# Altium footprint library SAMTEC SMD.PcbLib: 165 footprints (part 1 of 17) (continued)
## SAMTEC_ASP-134486-01 [mm] "Connector VITA 57, 400 Female contacts in 10 row abcdefghj" (continued)

## SAMTEC_ASP-134488-01 [mm] "Connector VITA 57, 400 Male contacts in 10 row abcdefghj"
height 6.1
pads (402):
  round 0.5 hole 1.3 unplated mask+0.4: 1(-27.191,-3.048) 2(27.191,0)
  round 0.64 smd paste+0.125: a1(24.765,5.715) a2(23.495,5.715) a3(22.225,5.715) a4(20.955,5.715) a5(19.685,5.715) a6(18.415,5.715) a7(17.145,5.715) a8(15.875,5.715) a9(14.605,5.715) a10(13.335,5.715) a11(12.065,5.715) a12(10.795,5.715) a13(9.525,5.715) a14(8.255,5.715) a15(6.985,5.715) a16(5.715,5.715) a17(4.445,5.715) a18(3.175,5.715) a19(1.905,5.715) a20(0.635,5.715) a21(-0.635,5.715) a22(-1.905,5.715) a23(-3.175,5.715) a24(-4.445,5.715) a25(-5.715,5.715) a26(-6.985,5.715) a27(-8.255,5.715) a28(-9.525,5.715) a29(-10.795,5.715) a30(-12.065,5.715) a31(-13.335,5.715) a32(-14.605,5.715) a33(-15.875,5.715) a34(-17.145,5.715) a35(-18.415,5.715) a36(-19.685,5.715) a37(-20.955,5.715) a38(-22.225,5.715) a39(-23.495,5.715) a40(-24.765,5.715) b1(24.765,4.445) b2(23.495,4.445) b3(22.225,4.445) b4(20.955,4.445) b5(19.685,4.445) b6(18.415,4.445) b7(17.145,4.445) b8(15.875,4.445) b9(14.605,4.445) b10(13.335,4.445) b11(12.065,4.445) b12(10.795,4.445) b13(9.525,4.445) b14(8.255,4.445) b15(6.985,4.445) b16(5.715,4.445) b17(4.445,4.445) b18(3.175,4.445) b19(1.905,4.445) b20(0.635,4.445) b21(-0.635,4.445) b22(-1.905,4.445) b23(-3.175,4.445) b24(-4.445,4.445) b25(-5.715,4.445) b26(-6.985,4.445) b27(-8.255,4.445) b28(-9.525,4.445) b29(-10.795,4.445) b30(-12.065,4.445) b31(-13.335,4.445) b32(-14.605,4.445) b33(-15.875,4.445) b34(-17.145,4.445) b35(-18.415,4.445) b36(-19.685,4.445) b37(-20.955,4.445) b38(-22.225,4.445) b39(-23.495,4.445) b40(-24.765,4.445) c1(24.765,3.175) c2(23.495,3.175) c3(22.225,3.175) c4(20.955,3.175) c5(19.685,3.175) c6(18.415,3.175) c7(17.145,3.175) c8(15.875,3.175) c9(14.605,3.175) c10(13.335,3.175) c11(12.065,3.175) c12(10.795,3.175) c13(9.525,3.175) c14(8.255,3.175) c15(6.985,3.175) c16(5.715,3.175) c17(4.445,3.175) c18(3.175,3.175) c19(1.905,3.175) c20(0.635,3.175) c21(-0.635,3.175) c22(-1.905,3.175) c23(-3.175,3.175) c24(-4.445,3.175) c25(-5.715,3.175) c26(-6.985,3.175) c27(-8.255,3.175) c28(-9.525,3.175) c29(-10.795,3.175) c30(-12.065,3.175) c31(-13.335,3.175) c32(-14.605,3.175) c33(-15.875,3.175) c34(-17.145,3.175) c35(-18.415,3.175) c36(-19.685,3.175) c37(-20.955,3.175) c38(-22.225,3.175) c39(-23.495,3.175) c40(-24.765,3.175) d1(24.765,1.905) d2(23.495,1.905) d3(22.225,1.905) d4(20.955,1.905) d5(19.685,1.905) d6(18.415,1.905) d7(17.145,1.905) d8(15.875,1.905) d9(14.605,1.905) d10(13.335,1.905) d11(12.065,1.905) d12(10.795,1.905) d13(9.525,1.905) d14(8.255,1.905) d15(6.985,1.905) d16(5.715,1.905) d17(4.445,1.905) d18(3.175,1.905) d19(1.905,1.905) d20(0.635,1.905) d21(-0.635,1.905) d22(-1.905,1.905) d23(-3.175,1.905) d24(-4.445,1.905) d25(-5.715,1.905) d26(-6.985,1.905) d27(-8.255,1.905) d28(-9.525,1.905) d29(-10.795,1.905) d30(-12.065,1.905) d31(-13.335,1.905) d32(-14.605,1.905) d33(-15.875,1.905) d34(-17.145,1.905) d35(-18.415,1.905) d36(-19.685,1.905) d37(-20.955,1.905) d38(-22.225,1.905) d39(-23.495,1.905) d40(-24.765,1.905) e1(24.765,0.635) e2(23.495,0.635) e3(22.225,0.635) e4(20.955,0.635) e5(19.685,0.635) e6(18.415,0.635) e7(17.145,0.635) e8(15.875,0.635) e9(14.605,0.635) e10(13.335,0.635) e11(12.065,0.635) e12(10.795,0.635) e13(9.525,0.635) e14(8.255,0.635) e15(6.985,0.635) e16(5.715,0.635) e17(4.445,0.635) e18(3.175,0.635) e19(1.905,0.635) e20(0.635,0.635) e21(-0.635,0.635) e22(-1.905,0.635) e23(-3.175,0.635) e24(-4.445,0.635) e25(-5.715,0.635) e26(-6.985,0.635) e27(-8.255,0.635) e28(-9.525,0.635) e29(-10.795,0.635) e30(-12.065,0.635) e31(-13.335,0.635) e32(-14.605,0.635) e33(-15.875,0.635) e34(-17.145,0.635) e35(-18.415,0.635) e36(-19.685,0.635) e37(-20.955,0.635) e38(-22.225,0.635) e39(-23.495,0.635) e40(-24.765,0.635) f1(24.765,-0.635) f2(23.495,-0.635) f3(22.225,-0.635) f4(20.955,-0.635) f5(19.685,-0.635) f6(18.415,-0.635) f7(17.145,-0.635) f8(15.875,-0.635) f9(14.605,-0.635) f10(13.335,-0.635) f11(12.065,-0.635) f12(10.795,-0.635) f13(9.525,-0.635) f14(8.255,-0.635) f15(6.985,-0.635) f16(5.715,-0.635) f17(4.445,-0.635) f18(3.175,-0.635) f19(1.905,-0.635) f20(0.635,-0.635) f21(-0.635,-0.635) f22(-1.905,-0.635) f23(-3.175,-0.635) f24(-4.445,-0.635) f25(-5.715,-0.635) f26(-6.985,-0.635) f27(-8.255,-0.635) f28(-9.525,-0.635) f29(-10.795,-0.635) f30(-12.065,-0.635) f31(-13.335,-0.635) f32(-14.605,-0.635) f33(-15.875,-0.635) f34(-17.145,-0.635) f35(-18.415,-0.635) f36(-19.685,-0.635) f37(-20.955,-0.635) f38(-22.225,-0.635) f39(-23.495,-0.635) f40(-24.765,-0.635) g1(24.765,-1.905) g2(23.495,-1.905) g3(22.225,-1.905) g4(20.955,-1.905) g5(19.685,-1.905) g6(18.415,-1.905) g7(17.145,-1.905) g8(15.875,-1.905) g9(14.605,-1.905) g10(13.335,-1.905) g11(12.065,-1.905) g12(10.795,-1.905) g13(9.525,-1.905) g14(8.255,-1.905) g15(6.985,-1.905) g16(5.715,-1.905) g17(4.445,-1.905) g18(3.175,-1.905) g19(1.905,-1.905) g20(0.635,-1.905) g21(-0.635,-1.905) g22(-1.905,-1.905) g23(-3.175,-1.905) g24(-4.445,-1.905) g25(-5.715,-1.905) g26(-6.985,-1.905) g27(-8.255,-1.905) g28(-9.525,-1.905) g29(-10.795,-1.905) g30(-12.065,-1.905) g31(-13.335,-1.905) g32(-14.605,-1.905) g33(-15.875,-1.905) g34(-17.145,-1.905) g35(-18.415,-1.905) g36(-19.685,-1.905) g37(-20.955,-1.905) g38(-22.225,-1.905) g39(-23.495,-1.905) g40(-24.765,-1.905) h1(24.765,-3.175) h2(23.495,-3.175) h3(22.225,-3.175) h4(20.955,-3.175) h5(19.685,-3.175) h6(18.415,-3.175) h7(17.145,-3.175) h8(15.875,-3.175) h9(14.605,-3.175) h10(13.335,-3.175) h11(12.065,-3.175) h12(10.795,-3.175) h13(9.525,-3.175) h14(8.255,-3.175) h15(6.985,-3.175) h16(5.715,-3.175) h17(4.445,-3.175) h18(3.175,-3.175) h19(1.905,-3.175) h20(0.635,-3.175) h21(-0.635,-3.175) h22(-1.905,-3.175) h23(-3.175,-3.175) h24(-4.445,-3.175) h25(-5.715,-3.175) h26(-6.985,-3.175) h27(-8.255,-3.175) h28(-9.525,-3.175) h29(-10.795,-3.175) h30(-12.065,-3.175) h31(-13.335,-3.175) h32(-14.605,-3.175) h33(-15.875,-3.175) h34(-17.145,-3.175) h35(-18.415,-3.175) h36(-19.685,-3.175) h37(-20.955,-3.175) h38(-22.225,-3.175) h39(-23.495,-3.175) h40(-24.765,-3.175) j1(24.765,-4.445) j2(23.495,-4.445) j3(22.225,-4.445) j4(20.955,-4.445) j5(19.685,-4.445) j6(18.415,-4.445) j7(17.145,-4.445) j8(15.875,-4.445) j9(14.605,-4.445) j10(13.335,-4.445) j11(12.065,-4.445) j12(10.795,-4.445) j13(9.525,-4.445) j14(8.255,-4.445) j15(6.985,-4.445) j16(5.715,-4.445) j17(4.445,-4.445) j18(3.175,-4.445) j19(1.905,-4.445) j20(0.635,-4.445) j21(-0.635,-4.445) j22(-1.905,-4.445) j23(-3.175,-4.445) j24(-4.445,-4.445) j25(-5.715,-4.445) j26(-6.985,-4.445) j27(-8.255,-4.445) j28(-9.525,-4.445) j29(-10.795,-4.445) j30(-12.065,-4.445) j31(-13.335,-4.445) j32(-14.605,-4.445) j33(-15.875,-4.445) j34(-17.145,-4.445) j35(-18.415,-4.445) j36(-19.685,-4.445) j37(-20.955,-4.445) j38(-22.225,-4.445) j39(-23.495,-4.445) j40(-24.765,-4.445) k1(24.765,-5.715) k2(23.495,-5.715) k3(22.225,-5.715) k4(20.955,-5.715) k5(19.685,-5.715) k6(18.415,-5.715) k7(17.145,-5.715) k8(15.875,-5.715) k9(14.605,-5.715) k10(13.335,-5.715) k11(12.065,-5.715) k12(10.795,-5.715) k13(9.525,-5.715) k14(8.255,-5.715) k15(6.985,-5.715) k16(5.715,-5.715) k17(4.445,-5.715) k18(3.175,-5.715) k19(1.905,-5.715) k20(0.635,-5.715) k21(-0.635,-5.715) k22(-1.905,-5.715) k23(-3.175,-5.715) k24(-4.445,-5.715) k25(-5.715,-5.715) k26(-6.985,-5.715) k27(-8.255,-5.715) k28(-9.525,-5.715) k29(-10.795,-5.715) k30(-12.065,-5.715) k31(-13.335,-5.715) k32(-14.605,-5.715) k33(-15.875,-5.715) k34(-17.145,-5.715) k35(-18.415,-5.715) k36(-19.685,-5.715) k37(-20.955,-5.715) k38(-22.225,-5.715) k39(-23.495,-5.715) k40(-24.765,-5.715)
Top Overlay:
  drawing of 637 lines, arcs and shapes, not listed
  text "1" at 25.417,-8.073 h1
  text "40" at -27.305,-7.112 h1
  text "k" at 29.989,-5.914 h1
  text "j" at 29.862,-4.771 h1
  text "g" at 29.862,-2.231 h1
  text "h" at 29.972,-3.556 h1
  text "f" at 30.116,-0.961 h1
  text "a" at 29.972,5.461 h1
  text "b" at 29.972,4.191 h1
  text "c" at 29.972,2.921 h1
  text "d" at 29.989,1.545 h1
  text "e" at 29.949,0.307 h1
Mechanical 8:
  drawing of 1622 lines, arcs and shapes, not listed
Mechanical 14:
  drawing of 4433 lines, arcs and shapes, not listed
  text "1" at 25.417,-8.073 h1
  text "40" at -27.305,-7.112 h1
  text "k" at 29.989,-5.914 h1
  text "j" at 29.862,-4.771 h1
  text "g" at 29.862,-2.231 h1
  text "h" at 29.972,-3.556 h1
  text "f" at 30.116,-0.961 h1
  text "e" at 29.949,0.307 h1
  text "d" at 29.989,1.545 h1
  text "c" at 29.972,2.921 h1
  text "b" at 29.972,4.191 h1
  text "a" at 29.972,5.461 h1
3D body "SAMTEC_ASP-134488-01.stp": height 5.61, standoff -1.27, extent -27.889,-7.341 28.778,7.341

## SAMTEC_ASP-134603-01 [mm] "Connector VITA 57 (Low Pin Count version), 160 Female contacts in 4 row cdgh"
height 6.55
pads (162):
  round 0.5 hole 1.3 unplated mask+0.4: 1(-27.19,0) 2(27.19,-3.05)
  round 0.64 smd paste+0.125: c1(24.765,-3.175) c2(23.495,-3.175) c3(22.225,-3.175) c4(20.955,-3.175) c5(19.685,-3.175) c6(18.415,-3.175) c7(17.145,-3.175) c8(15.875,-3.175) c9(14.605,-3.175) c10(13.335,-3.175) c11(12.065,-3.175) c12(10.795,-3.175) c13(9.525,-3.175) c14(8.255,-3.175) c15(6.985,-3.175) c16(5.715,-3.175) c17(4.445,-3.175) c18(3.175,-3.175) c19(1.905,-3.175) c20(0.635,-3.175) c21(-0.635,-3.175) c22(-1.905,-3.175) c23(-3.175,-3.175) c24(-4.445,-3.175) c25(-5.715,-3.175) c26(-6.985,-3.175) c27(-8.255,-3.175) c28(-9.525,-3.175) c29(-10.795,-3.175) c30(-12.065,-3.175) c31(-13.335,-3.175) c32(-14.605,-3.175) c33(-15.875,-3.175) c34(-17.145,-3.175) c35(-18.415,-3.175) c36(-19.685,-3.175) c37(-20.955,-3.175) c38(-22.225,-3.175) c39(-23.495,-3.175) c40(-24.765,-3.175) d1(24.765,-1.905) d2(23.495,-1.905) d3(22.225,-1.905) d4(20.955,-1.905) d5(19.685,-1.905) d6(18.415,-1.905) d7(17.145,-1.905) d8(15.875,-1.905) d9(14.605,-1.905) d10(13.335,-1.905) d11(12.065,-1.905) d12(10.795,-1.905) d13(9.525,-1.905) d14(8.255,-1.905) d15(6.985,-1.905) d16(5.715,-1.905) d17(4.445,-1.905) d18(3.175,-1.905) d19(1.905,-1.905) d20(0.635,-1.905) d21(-0.635,-1.905) d22(-1.905,-1.905) d23(-3.175,-1.905) d24(-4.445,-1.905) d25(-5.715,-1.905) d26(-6.985,-1.905) d27(-8.255,-1.905) d28(-9.525,-1.905) d29(-10.795,-1.905) d30(-12.065,-1.905) d31(-13.335,-1.905) d32(-14.605,-1.905) d33(-15.875,-1.905) d34(-17.145,-1.905) d35(-18.415,-1.905) d36(-19.685,-1.905) d37(-20.955,-1.905) d38(-22.225,-1.905) d39(-23.495,-1.905) d40(-24.765,-1.905) g1(24.765,1.905) g2(23.495,1.905) g3(22.225,1.905) g4(20.955,1.905) g5(19.685,1.905) g6(18.415,1.905) g7(17.145,1.905) g8(15.875,1.905) g9(14.605,1.905) g10(13.335,1.905) g11(12.065,1.905) g12(10.795,1.905) g13(9.525,1.905) g14(8.255,1.905) g15(6.985,1.905) g16(5.715,1.905) g17(4.445,1.905) g18(3.175,1.905) g19(1.905,1.905) g20(0.635,1.905) g21(-0.635,1.905) g22(-1.905,1.905) g23(-3.175,1.905) g24(-4.445,1.905) g25(-5.715,1.905) g26(-6.985,1.905) g27(-8.255,1.905) g28(-9.525,1.905) g29(-10.795,1.905) g30(-12.065,1.905) g31(-13.335,1.905) g32(-14.605,1.905) g33(-15.875,1.905) g34(-17.145,1.905) g35(-18.415,1.905) g36(-19.685,1.905) g37(-20.955,1.905) g38(-22.225,1.905) g39(-23.495,1.905) g40(-24.765,1.905) h1(24.765,3.175) h2(23.495,3.175) h3(22.225,3.175) h4(20.955,3.175) h5(19.685,3.175) h6(18.415,3.175) h7(17.145,3.175) h8(15.875,3.175) h9(14.605,3.175) h10(13.335,3.175) h11(12.065,3.175) h12(10.795,3.175) h13(9.525,3.175) h14(8.255,3.175) h15(6.985,3.175) h16(5.715,3.175) h17(4.445,3.175) h18(3.175,3.175) h19(1.905,3.175) h20(0.635,3.175) h21(-0.635,3.175) h22(-1.905,3.175) h23(-3.175,3.175) h24(-4.445,3.175) h25(-5.715,3.175) h26(-6.985,3.175) h27(-8.255,3.175) h28(-9.525,3.175) h29(-10.795,3.175) h30(-12.065,3.175) h31(-13.335,3.175) h32(-14.605,3.175) h33(-15.875,3.175) h34(-17.145,3.175) h35(-18.415,3.175) h36(-19.685,3.175) h37(-20.955,3.175) h38(-22.225,3.175) h39(-23.495,3.175) h40(-24.765,3.175)
Top Overlay:
  lines w0.2: -27.889,-1.213 -27.889,-2.197 -28.727,-2.197 -28.727,-6.617 27.889,-6.617 27.889,-4.263 ; -27.889,1.213 -27.889,2.197 -28.727,2.197 -28.727,6.617 27.889,6.617 27.889,2.845 28.727,2.845 28.727,-2.845 28.575,-2.845 ; -27.305,-1.395 -27.305,-2.477 ; -27.305,1.395 -27.305,2.476 ; -27.051,-1.393 -27.051,-2.858 ; -27.051,1.393 -27.051,2.857 ; -25.5,-5.855 -28.067,-5.855 ; -25.5,5.855 -28.067,5.855 ; -24.994,-6.236 -28.448,-6.236 ; -24.994,6.236 -28.448,6.236 ; 25.2,-6.109 27.305,-6.109 ; 25.2,6.109 27.305,6.109 ; 27.051,-4.443 27.051,-5.855 27.305,-6.109 ; 27.305,-4.445 27.305,-6.109 ; 28.067,-1.959 28.067,2.184 ; 28.448,-2.436 28.448,2.565 ; -28.448,-6.236 -28.448,-2.477 ; -28.448,-6.236 -28.067,-5.855 ; -28.448,-2.477 -27.305,-2.477 ; -28.448,-2.477 -28.067,-2.858 ; -28.448,2.476 -28.448,6.236 ; -28.448,2.476 -27.305,2.476 ; -28.448,2.476 -28.067,2.857 ; -28.448,6.236 -28.067,5.855 ; -28.067,-5.855 -28.067,-2.858 ; -28.067,-2.858 -27.051,-2.858 ; -28.067,2.857 -27.051,2.857 ; -28.067,2.857 -28.067,5.855 ; -27.305,-2.477 -27.051,-2.858 ; -27.305,2.476 -27.051,2.857 ; 27.051,2.184 27.051,5.855 27.305,6.109 ; 27.051,2.184 28.067,2.184 ; 27.051,2.184 27.305,2.565 ; 27.305,2.565 28.448,2.565 ; 27.305,2.565 27.305,6.109 ; 28.067,2.184 28.448,2.565
  text "e" at 29.949,-0.836 h1
  text "d" at 29.989,-2.392 h1
  text "c" at 29.972,-3.556 h1
  text "b" at 29.972,-4.826 h1
  text "a" at 29.972,-6.096 h1
  text "f" at 30.116,0.436 h1
  text "h" at 29.972,2.921 h1
  text "g" at 29.862,1.579 h1
  text "j" at 29.989,4.246 h1
  text "k" at 29.989,5.516 h1
  text "40" at -26.289,-5.461 h1.2
  text "1" at 25.29,-7.438 h1
Mechanical 8:
  drawing of 1618 lines, arcs and shapes, not listed
Mechanical 14:
  drawing of 1424 lines, arcs and shapes, not listed
  text "a" at 29.972,-6.096 h1
  text "b" at 29.972,-4.826 h1
  text "c" at 29.972,-3.556 h1
  text "d" at 29.989,-2.392 h1
  text "e" at 29.949,-0.836 h1
  text "f" at 30.116,0.436 h1
  text "h" at 29.972,2.921 h1
  text "g" at 29.862,1.579 h1
  text "j" at 29.989,4.246 h1
  text "k" at 29.989,5.516 h1
  text "40" at -26.289,-5.461 h1.2
  text "1" at 25.29,-7.438 h1
3D body "SAMTEC_ASP-134603-01.stp": height 6.55, standoff -1.27, extent -28.727,-6.618 28.727,6.618

## SAMTEC_ASP-134604-01 [mm] "Connector VITA 57, 160 Male contacts in 4 row cdgh"
height 6.1
pads (162):
  round 0.5 hole 1.3 unplated mask+0.4: 1(-27.191,-3.048) 2(27.191,0)
  round 0.64 smd paste+0.125: c1(24.765,3.175) c2(23.495,3.175) c3(22.225,3.175) c4(20.955,3.175) c5(19.685,3.175) c6(18.415,3.175) c7(17.145,3.175) c8(15.875,3.175) c9(14.605,3.175) c10(13.335,3.175) c11(12.065,3.175) c12(10.795,3.175) c13(9.525,3.175) c14(8.255,3.175) c15(6.985,3.175) c16(5.715,3.175) c17(4.445,3.175) c18(3.175,3.175) c19(1.905,3.175) c20(0.635,3.175) c21(-0.635,3.175) c22(-1.905,3.175) c23(-3.175,3.175) c24(-4.445,3.175) c25(-5.715,3.175) c26(-6.985,3.175) c27(-8.255,3.175) c28(-9.525,3.175) c29(-10.795,3.175) c30(-12.065,3.175) c31(-13.335,3.175) c32(-14.605,3.175) c33(-15.875,3.175) c34(-17.145,3.175) c35(-18.415,3.175) c36(-19.685,3.175) c37(-20.955,3.175) c38(-22.225,3.175) c39(-23.495,3.175) c40(-24.765,3.175) d1(24.765,1.905) d2(23.495,1.905) d3(22.225,1.905) d4(20.955,1.905) d5(19.685,1.905) d6(18.415,1.905) d7(17.145,1.905) d8(15.875,1.905) d9(14.605,1.905) d10(13.335,1.905) d11(12.065,1.905) d12(10.795,1.905) d13(9.525,1.905) d14(8.255,1.905) d15(6.985,1.905) d16(5.715,1.905) d17(4.445,1.905) d18(3.175,1.905) d19(1.905,1.905) d20(0.635,1.905) d21(-0.635,1.905) d22(-1.905,1.905) d23(-3.175,1.905) d24(-4.445,1.905) d25(-5.715,1.905) d26(-6.985,1.905) d27(-8.255,1.905) d28(-9.525,1.905) d29(-10.795,1.905) d30(-12.065,1.905) d31(-13.335,1.905) d32(-14.605,1.905) d33(-15.875,1.905) d34(-17.145,1.905) d35(-18.415,1.905) d36(-19.685,1.905) d37(-20.955,1.905) d38(-22.225,1.905) d39(-23.495,1.905) d40(-24.765,1.905) g1(24.765,-1.905) g2(23.495,-1.905) g3(22.225,-1.905) g4(20.955,-1.905) g5(19.685,-1.905) g6(18.415,-1.905) g7(17.145,-1.905) g8(15.875,-1.905) g9(14.605,-1.905) g10(13.335,-1.905) g11(12.065,-1.905) g12(10.795,-1.905) g13(9.525,-1.905) g14(8.255,-1.905) g15(6.985,-1.905) g16(5.715,-1.905) g17(4.445,-1.905) g18(3.175,-1.905) g19(1.905,-1.905) g20(0.635,-1.905) g21(-0.635,-1.905) g22(-1.905,-1.905) g23(-3.175,-1.905) g24(-4.445,-1.905) g25(-5.715,-1.905) g26(-6.985,-1.905) g27(-8.255,-1.905) g28(-9.525,-1.905) g29(-10.795,-1.905) g30(-12.065,-1.905) g31(-13.335,-1.905) g32(-14.605,-1.905) g33(-15.875,-1.905) g34(-17.145,-1.905) g35(-18.415,-1.905) g36(-19.685,-1.905) g37(-20.955,-1.905) g38(-22.225,-1.905) g39(-23.495,-1.905) g40(-24.765,-1.905) h1(24.765,-3.175) h2(23.495,-3.175) h3(22.225,-3.175) h4(20.955,-3.175) h5(19.685,-3.175) h6(18.415,-3.175) h7(17.145,-3.175) h8(15.875,-3.175) h9(14.605,-3.175) h10(13.335,-3.175) h11(12.065,-3.175) h12(10.795,-3.175) h13(9.525,-3.175) h14(8.255,-3.175) h15(6.985,-3.175) h16(5.715,-3.175) h17(4.445,-3.175) h18(3.175,-3.175) h19(1.905,-3.175) h20(0.635,-3.175) h21(-0.635,-3.175) h22(-1.905,-3.175) h23(-3.175,-3.175) h24(-4.445,-3.175) h25(-5.715,-3.175) h26(-6.985,-3.175) h27(-8.255,-3.175) h28(-9.525,-3.175) h29(-10.795,-3.175) h30(-12.065,-3.175) h31(-13.335,-3.175) h32(-14.605,-3.175) h33(-15.875,-3.175) h34(-17.145,-3.175) h35(-18.415,-3.175) h36(-19.685,-3.175) h37(-20.955,-3.175) h38(-22.225,-3.175) h39(-23.495,-3.175) h40(-24.765,-3.175)
Top Overlay:
  drawing of 605 lines, arcs and shapes, not listed
  text "1" at 25.417,-8.073 h1
  text "40" at -24.3,-5.8 h1
  text "g" at 29.862,-2.231 h1
  text "h" at 29.972,-3.556 h1
  text "c" at 29.972,2.921 h1
  text "d" at 29.989,1.545 h1
Mechanical 8:
  drawing of 648 lines, arcs and shapes, not listed
Mechanical 14:
  drawing of 4433 lines, arcs and shapes, not listed
  text "1" at 25.417,-8.073 h1
  text "g" at 29.862,-2.231 h1
  text "h" at 29.972,-3.556 h1
  text "d" at 29.989,1.545 h1
  text "c" at 29.972,2.921 h1
3D body "SAMTEC_ASP-134604-01.stp": height 5.61, standoff -1.27, extent -27.889,-7.34 28.778,7.341

## SAMTEC_BAR-J-22 [mm] "22 Positions Bulls Eye® High-Density, High-Performance Test Point Array"
height 12
pads (180):
  round 0.76 hole 0.25: 1(-4.953,5.715) 2(-1.651,5.715) 3(1.651,5.715) 4(4.953,5.715) 5(-6.604,2.857) 6(-3.302,2.857) 7(0,2.857) 8(3.302,2.857) 9(6.604,2.857) 10(-4.953,0) 11(-1.651,0) 12(1.651,0) 13(4.953,0) 14(-6.604,-2.857) 15(-3.302,-2.857) 16(0,-2.857) 17(3.302,-2.857) 18(6.604,-2.857) 19(-4.953,-5.715) 20(-1.651,-5.715) 21(1.651,-5.715) 22(4.953,-5.715)
  round 0.5 hole 0.25 mask-0.2: G1(-5.968,5.715) G1(-5.671,4.997) G1(-5.671,6.433) G1(-4.953,6.73) G1(-4.235,4.997) G1(-4.235,6.433) G1(-3.938,5.715) G2(-2.666,5.715) G2(-2.369,4.997) G2(-2.369,6.433) G2(-1.651,6.73) G2(-0.933,4.997) G2(-0.933,6.433) G2(-0.636,5.715) G3(0.636,5.715) G3(0.933,4.997) G3(0.933,6.433) G3(1.651,6.73) G3(2.369,4.997) G3(2.369,6.433) G3(2.666,5.715) G4(3.938,5.715) G4(4.235,4.997) G4(4.235,6.433) G4(4.953,6.73) G4(5.671,4.997) G4(5.671,6.433) G4(5.968,5.715) G5(-7.619,2.857) G5(-7.322,2.14) G5(-7.322,3.575) G5(-6.604,3.872) G5(-5.886,2.14) G5(-5.886,3.575) G5(-5.589,2.857) G6(-4.317,2.857) G6(-4.02,2.14) G6(-4.02,3.575) G6(-3.302,3.872) G6(-2.584,2.14) G6(-2.584,3.575) G6(-2.287,2.857) G7(-1.015,2.857) G7(-0.718,2.14) G7(-0.718,3.575) G7(0,3.872) G7(0.718,2.14) G7(0.718,3.575) G7(1.015,2.857) G8(2.287,2.857) G8(2.584,2.14) G8(2.584,3.575) G8(3.302,3.872) G8(4.02,2.14) G8(4.02,3.575) G8(4.317,2.857) G9(5.589,2.857) G9(5.886,2.14) G9(5.886,3.575) G9(6.604,3.872) G9(7.322,2.14) G9(7.322,3.575) G9(7.619,2.857) G10(-5.968,0) G10(-5.671,-0.718) G10(-5.671,0.718) G10(-4.953,1.015) G10(-4.235,-0.718) G10(-4.235,0.718) G10(-3.938,0) G11(-2.666,0) G11(-2.369,-0.718) G11(-2.369,0.718) G11(-1.651,1.015) G11(-0.933,-0.718) G11(-0.933,0.718) G11(-0.636,0) G12(0.636,0) G12(0.933,-0.718) G12(0.933,0.718) G12(1.651,1.015) G12(2.369,-0.718) G12(2.369,0.718) G12(2.666,0) G13(3.938,0) G13(4.235,-0.718) G13(4.235,0.718) G13(4.953,1.015) G13(5.671,-0.718) G13(5.671,0.718) G13(5.968,0) G14(-7.619,-2.857) G14(-7.322,-3.575) G14(-7.322,-2.14) G14(-6.604,-1.843) G14(-5.886,-3.575) G14(-5.886,-2.14) G14(-5.589,-2.857) G15(-4.317,-2.857) G15(-4.02,-3.575) G15(-4.02,-2.14) G15(-3.302,-1.843) G15(-2.584,-3.575) G15(-2.584,-2.14) G15(-2.287,-2.857) G16(-1.015,-2.857) G16(-0.718,-3.575) G16(-0.718,-2.14) G16(0,-1.843) G16(0.718,-3.575) G16(0.718,-2.14) G16(1.015,-2.857) G17(2.287,-2.857) G17(2.584,-3.575) G17(2.584,-2.14) G17(3.302,-1.843) G17(4.02,-3.575) G17(4.02,-2.14) G17(4.317,-2.857) G18(5.589,-2.857) G18(5.886,-3.575) G18(5.886,-2.14) G18(6.604,-1.843) G18(7.322,-3.575) G18(7.322,-2.14) G18(7.619,-2.857) G19(-5.968,-5.715) G19(-5.671,-6.433) G19(-5.671,-4.997) G19(-4.953,-4.7) G19(-4.235,-6.433) G19(-4.235,-4.997) G19(-3.938,-5.715) G20(-2.666,-5.715) G20(-2.369,-6.433) G20(-2.369,-4.997) G20(-1.651,-4.7) G20(-0.933,-6.433) G20(-0.933,-4.997) G20(-0.636,-5.715) G21(0.636,-5.715) G21(0.933,-6.433) G21(0.933,-4.997) G21(1.651,-4.7) G21(2.369,-6.433) G21(2.369,-4.997) G21(2.666,-5.715) G22(3.938,-5.715) G22(4.235,-6.433) G22(4.235,-4.997) G22(4.953,-4.7) G22(5.671,-6.433) G22(5.671,-4.997) G22(5.968,-5.715)
  round 1 hole 2.8 unplated mask+0.9: MECH(-8.255,0) MECH(8.255,0)
  round 1 hole 1.65 unplated mask+0.325: MECH(-8.04,5.61) MECH(8.04,5.61)
Top Layer:
  region: -6.683,5.719 -5.713,5.719 -5.707,5.818 -5.655,6.01 -5.556,6.182 -5.416,6.322 -5.244,6.421 -5.052,6.472 -4.854,6.472 -4.662,6.421 -4.491,6.322 -4.35,6.182 -4.251,6.01 -4.2,5.818 -4.193,5.719 -2.411,5.719 -2.405,5.818 -2.353,6.01 -2.254,6.182 -2.114,6.322 -1.942,6.421 -1.75,6.472 -1.552,6.472 -1.36,6.421 -1.189,6.322 -1.048,6.182 -0.949,6.01 -0.898,5.818 -0.891,5.719 0.891,5.719 0.897,5.818 0.949,6.01 1.048,6.182 1.188,6.322 1.36,6.421 1.552,6.472 1.75,6.472 1.942,6.421 2.113,6.322 2.254,6.182 2.353,6.01 2.404,5.818 2.411,5.719 4.193,5.719 4.199,5.818 4.251,6.01 4.35,6.182 4.49,6.322 4.662,6.421 4.854,6.472 5.052,6.472 5.244,6.421 5.415,6.322 5.556,6.182 5.655,6.01 5.706,5.818 5.713,5.719 6.683,5.719 6.683,5.89 6.617,6.225 6.487,6.54 6.298,6.824 6.057,7.066 5.773,7.256 5.458,7.386 5.123,7.453 4.953,7.453 -4.953,7.453 -5.124,7.453 -5.458,7.386 -5.773,7.255 -6.057,7.065 -6.298,6.824 -6.487,6.54 -6.617,6.224 -6.683,5.89
  region: 179 vertices and 0 holes, not listed, extent -8.354,2.857 8.354,5.719
  region: 173 vertices and 0 holes, not listed, extent -8.354,0 8.354,2.857
  region: 173 vertices and 0 holes, not listed, extent -8.354,-2.857 8.354,0
  region: 186 vertices and 0 holes, not listed, extent -8.354,-5.715 8.354,-2.857
  region: -6.683,-5.715 -6.683,-5.886 -6.617,-6.221 -6.487,-6.536 -6.298,-6.82 -6.057,-7.062 -5.774,-7.252 -5.458,-7.382 -5.124,-7.449 -4.953,-7.449 4.953,-7.449 5.124,-7.449 5.458,-7.382 5.774,-7.252 6.057,-7.062 6.298,-6.82 6.487,-6.536 6.617,-6.221 6.683,-5.886 6.683,-5.715 5.713,-5.715 5.706,-5.814 5.655,-6.006 5.556,-6.178 5.416,-6.318 5.244,-6.417 5.052,-6.468 4.854,-6.468 4.662,-6.417 4.49,-6.318 4.35,-6.178 4.251,-6.006 4.199,-5.814 4.193,-5.715 2.411,-5.715 2.404,-5.814 2.353,-6.006 2.254,-6.178 2.114,-6.318 1.942,-6.417 1.75,-6.468 1.552,-6.468 1.36,-6.417 1.188,-6.318 1.048,-6.178 0.949,-6.006 0.897,-5.814 0.891,-5.715 -0.891,-5.715 -0.897,-5.814 -0.949,-6.006 -1.048,-6.178 -1.188,-6.318 -1.36,-6.417 -1.552,-6.468 -1.75,-6.468 -1.942,-6.417 -2.114,-6.318 -2.254,-6.178 -2.353,-6.006 -2.404,-5.814 -2.411,-5.715 -4.193,-5.715 -4.199,-5.814 -4.251,-6.006 -4.35,-6.178 -4.49,-6.318 -4.662,-6.417 -4.854,-6.468 -5.052,-6.468 -5.244,-6.417 -5.416,-6.318 -5.556,-6.178 -5.655,-6.006 -5.706,-5.814 -5.713,-5.715
Top Overlay:
  lines w0.2: -7.949,-7.563 cw(c1.494,0) -7.949,7.563 cw(c-4.975,5.182) -4.975,8.992 4.975,8.992 cw(c4.975,5.182) 7.949,7.563 cw(c-1.494,0) 7.949,-7.563 cw(c4.975,-5.182) 4.975,-8.992 -4.975,-8.992 cw(c-4.975,-5.182) -7.949,-7.563
  text "1" at -5.233,9.602 h1
  text "22" at 4.852,-10.698 h1
Mechanical 8:
  drawing of 1124 lines, arcs and shapes, not listed
Mechanical 14:
  circle w0.1: c-4.953,5.719 r1.505
  circle w0.1: c-1.651,5.719 r1.505
  circle w0.1: c1.651,5.719 r1.505
  circle w0.1: c4.953,5.719 r1.505
  circle w0.1: c6.604,2.86 r1.505
  circle w0.1: c3.302,2.86 r1.505
  circle w0.1: c0,2.86 r1.505
  circle w0.1: c-3.302,2.86 r1.505
  circle w0.1: c-6.604,2.86 r1.505
  circle w0.1: c4.953,0 r1.505
  circle w0.1: c1.651,0 r1.505
  circle w0.1: c-1.651,0 r1.505
  circle w0.1: c-4.953,0 r1.505
  circle w0.1: c6.604,-2.86 r1.505
  circle w0.1: c4.953,-5.719 r1.505
  circle w0.1: c3.302,-2.86 r1.505
  circle w0.1: c1.651,-5.719 r1.505
  circle w0.1: c0,-2.86 r1.505
  circle w0.1: c-1.651,-5.719 r1.505
  circle w0.1: c-3.302,-2.86 r1.505
  circle w0.1: c-4.953,-5.719 r1.505
  circle w0.1: c-6.604,-2.86 r1.505
  circle w0.1: c8.255,0 r1.714
  circle w0.1: c-8.255,0 r1.714
  lines w0.1: -9.155,-0.52 -8.255,-1.039 -7.355,-0.52 -7.355,0.52 -8.255,1.039 -9.155,0.52 -9.155,-0.52 ; -7.949,-7.563 cw(c1.494,0) -7.949,7.563 cw(c-4.975,5.182) -4.975,8.992 4.975,8.992 cw(c4.975,5.182) 7.949,7.563 cw(c-1.494,0) 7.949,-7.563 cw(c4.975,-5.182) 4.975,-8.992 -4.975,-8.992 cw(c-4.975,-5.182) -7.949,-7.563 ; 7.355,-0.52 8.255,-1.039 9.155,-0.52 9.155,0.52 8.255,1.039 7.355,0.52 7.355,-0.52
  text "1" at -5.233,9.602 h1
  text "22" at 4.852,-10.698 h1
Drill Drawing:
  lines w0.254: -10.385,-7 -10.385,6.7 10.451,6.7 10.451,-7 -10.385,-7
  text "- Hard Gold Plating" at -9.213,-0.975 h1
  text "- Filled Holes" at -9.222,-2.7 h1
  text "- Backdrilling Process" at -9.213,-4.375 h1
  text "(See Datasheet)." at -6.09,-6.4 h1
  text "requirements. (If needed)" at -9.285,1.4 h1
  text "WARNING!" at -3.949,4.9 h1
  text "Specifics manufacturing" at -9.502,3.15 h1
3D body "SAMTEC_BAR-J-22.stp": height 12.06, standoff -3.45, extent -10.604,-8.992 10.604,8.992